# Altium footprint library Misc.PcbLib: 159 footprints (part 10 of 10)
Each footprint in its own frame and in the unit in brackets; x right, y up, seen from the top. Pads: shape width x height; smd on the part's side, far side on the other; paste and mask are expansions set on the pad; w line width, h text height; cw(c..) or ccw(c..) is an arc to the next point about the centre after c.
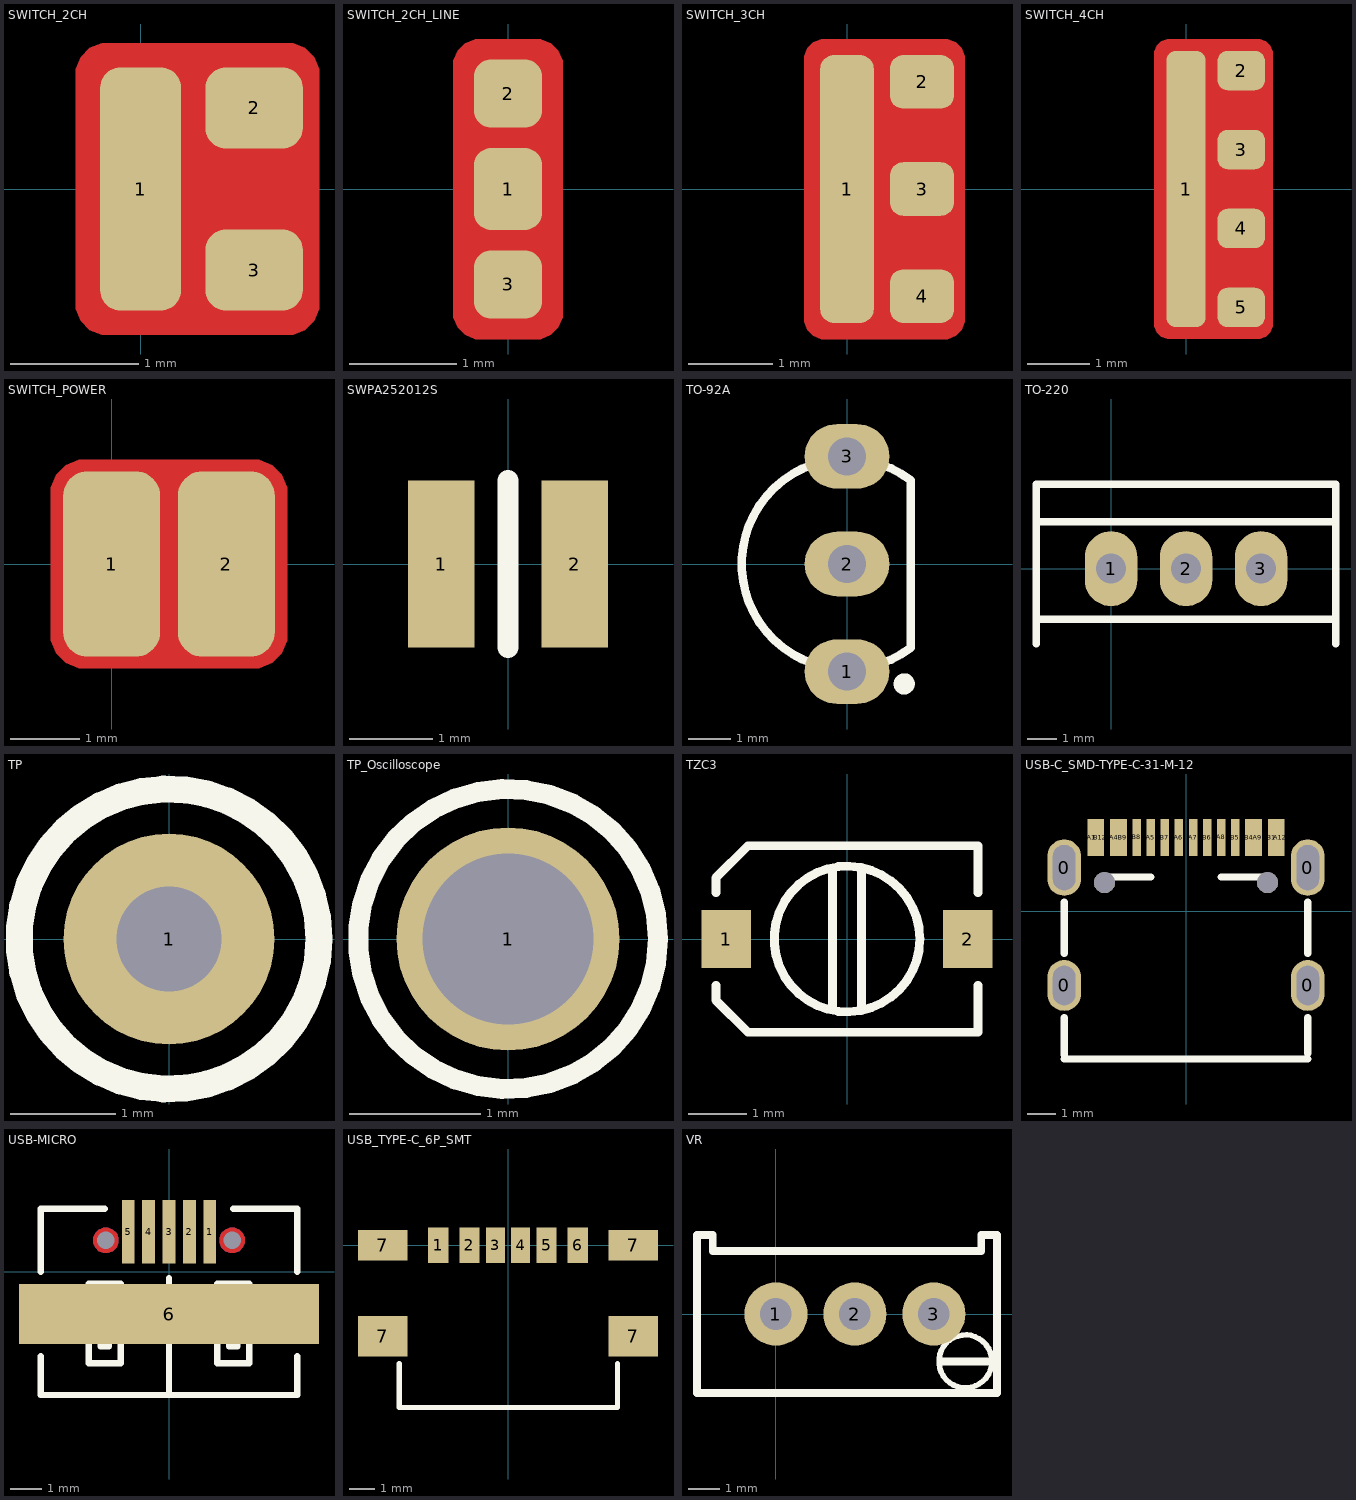
[diagram p9: the footprints below, top view; thin cyan lines are the x and y axes]

## SWITCH_2CH [mil]
pads (3):
  rrect50% 25x75 smd: 1(0,0)
  rrect50% 30x25 smd: 2(35,25) 3(35,-25)
Top Layer:
  pour cut-out: -20,35 -20,36.99 -18.48,40.66 -15.66,43.48 -11.99,45 -10,45 45,45 46.99,45 50.66,43.48 53.48,40.66 55,36.99 55,35 55,-35 55,-36.99 53.48,-40.66 50.66,-43.48 46.99,-45 45,-45 -10,-45 -11.99,-45 -15.66,-43.48 -18.48,-40.66 -20,-36.99 -20,-35
Top Solder:
  rectangle: 35,-35 52.5,35
  rectangle: 0,-40 35,40
  lines w3: 0,-40 35,-40 ; 0,40 35,40 ; 52.5,-25 52.5,25

## SWITCH_2CH_LINE [mil]
pads (3):
  rrect50% 25x30 smd: 1(0,0)
  rrect50% 25x25 smd: 2(0,35) 3(0,-35)
Top Layer:
  pour cut-out: -20,45 -20,46.99 -18.48,50.66 -15.66,53.48 -11.99,55 -10,55 10,55 11.99,55 15.66,53.48 18.48,50.66 20,46.99 20,45 20,-45 20,-46.99 18.48,-50.66 15.66,-53.48 11.99,-55 10,-55 -10,-55 -11.99,-55 -15.66,-53.48 -18.48,-50.66 -20,-46.99 -20,-45
Top Solder:
  rectangle: -15,-40 15,40
  lines w3: -15,-35 -15,35 ; 15,-35 15,35

## SWITCH_3CH [mil]
pads (4):
  rrect50% 25x125 smd: 1(0,0)
  rrect50% 30x25 smd: 2(35,50) 3(35,0) 4(35,-50)
Top Layer:
  pour cut-out: -20,60 -20,61.99 -18.48,65.66 -15.66,68.48 -11.99,70 -10,70 45,70 46.99,70 50.66,68.48 53.48,65.66 55,61.99 55,60 55,-60 55,-61.99 53.48,-65.66 50.66,-68.48 46.99,-70 45,-70 -10,-70 -11.99,-70 -15.66,-68.48 -18.48,-65.66 -20,-61.99 -20,-60
Top Solder:
  rectangle: 0,-65 35,65
  rectangle: 35,-50 52.5,50
  lines w3: 0,-65 35,-65 ; 0,65 35,65 ; 52.5,-50 52.5,50

## SWITCH_4CH [mil]
pads (5):
  rrect50% 25x175 smd: 1(0,0)
  rrect50% 30x25 smd: 2(35,75) 3(35,25) 4(35,-25) 5(35,-75)
Top Layer:
  pour cut-out: -20,85 -20,86.99 -18.48,90.66 -15.66,93.48 -11.99,95 -10,95 45,95 46.99,95 50.66,93.48 53.48,90.66 55,86.99 55,85 55,-85 55,-86.99 53.48,-90.66 50.66,-93.48 46.99,-95 45,-95 -10,-95 -11.99,-95 -15.66,-93.48 -18.48,-90.66 -20,-86.99 -20,-85
Top Solder:
  rectangle: 0,-90 35,90
  rectangle: 35,-75 52.5,75
  lines w3: -5,-90 30,-90 ; 0,90 35,90 ; 52.5,-75 52.5,75

## SWITCH_POWER [mil]
pads (2):
  rrect50% 55x105 smd: 1(0,0) 2(65,0)
Top Layer:
  pour cut-out: -34.43,39.37 -34.43,43.29 -31.43,50.52 -25.89,56.06 -18.66,59.06 -14.74,59.06 79.74,59.06 83.66,59.06 90.89,56.06 96.43,50.52 99.43,43.29 99.43,39.37 99.43,-39.37 99.43,-43.29 96.43,-50.52 90.89,-56.06 83.66,-59.06 79.74,-59.06 -14.74,-59.06 -18.66,-59.06 -25.89,-56.06 -31.43,-50.52 -34.43,-43.29 -34.43,-39.37
Top Solder:
  rectangle: 0,-55 65,55
  lines w3: 0,-55 65,-55 ; 0,55 65,55

## SWPA252012S [mm] "Wire Wound SMD Power Inductors"
height 1.2
pads (2):
  rect 0.8x2 smd: 1(-0.8,0) 2(0.8,0)
Top Overlay:
  lines w0.254: 0,-1 0,1
3D body: height 1.45, standoff 0, extent -1.25,-1 1.25,1

## TO-92A [mm] "TO, Flat Index; 3 In-Line, Axial Leads; Body Dia. 4.5mm; Leads 0.51 x 0.48 mm (max)"
height 6.86
pads (3):
  oval 2x1.524 hole 0.9: 1(0,-2.54) 2(0,0) 3(0,2.54)
Top Overlay:
  circle w0.25: c1.35,-2.83 r0.125
  lines w0.2: 1.5,-1.98 cw(c0,0) 1.5,1.98 1.5,-1.98
Mechanical 13:
  lines w0.1: 1.5,-1.98 cw(c0,0) 1.5,1.98 1.5,-1.98
Mechanical 15:
  lines w0.1: -0.5,0 0.5,0 ; 0,-0.5 0,0.5
3D body: height 6.86, standoff 2.2, extent -2.485,-2.495 1.501,2.495

## TO-220 [mil]
pads (3):
  oval 70x100 hole 40: 1(0,0) 2(100,0) 3(200,0)
Top Overlay:
  lines w10: -100,62.6 300,62.6 ; -99.56,-100 -100,-99.56 -100,112.6 300,112.6 300,-99.56 299.56,-100 ; -99.56,-67.52 299.56,-67.52
3D body "User Library-TO-220-1.STEP": height 740.16, standoff -392.91, extent -93.88,-83 295.89,94.16

## TP [mm]
pads (1):
  round 2 hole 1: 1(0,0)
Top Overlay:
  circle w0.254: c0,0 r1.422
3D body "User Library-TEST POINT RED Keystone 5010.step": height 8.13, standoff -3.1, extent -1.714,-1.46 1.461,1.715

## TP_Oscilloscope [mm]
pads (1):
  round 1.7 hole 1.3: 1(0,0)
Top Overlay:
  circle w0.152: c0,0 r1.143

## TZC3 [mm]
height 1.6
pads (2):
  rect 0.85x1 smd: 1(-2.075,0) 2(2.075,0)
Top Overlay:
  circle w0.152: c0,0 r1.25
  lines w0.152: -2.25,-0.8 -2.25,-1.05 -1.7,-1.6 2.25,-1.6 2.25,-0.8 ; -2.25,0.8 -2.25,1.05 -1.7,1.6 2.25,1.6 2.25,0.8 ; -0.25,-1.2 -0.25,1.2 ; 0.25,-1.2 0.25,1.2

## USB-C_SMD-TYPE-C-31-M-12 [mm]
pads (22):
  oval 1.2x1.8 hole 0.8 slot 1.4 at 90 deg: 0(-4.32,-2.624) 0(4.32,-2.624)
  oval 1.2x2 hole 0.8 slot 1.6 at 90 deg: 0(-4.32,1.556) 0(4.32,1.556)
  rect 0.3x1.3 smd: A1(-3.35,2.623) A4(-2.55,2.623) A5(-1.25,2.623) A6(-0.25,2.623) A7(0.25,2.623) A8(1.25,2.624) A9(2.55,2.623) A12(3.35,2.623) B1(3.05,2.623) B4(2.25,2.623) B5(1.75,2.623) B6(0.75,2.623) B7(-0.75,2.623) B8(-1.75,2.624) B9(-2.25,2.623) B12(-3.05,2.623)
  round 0.75 hole 0.75 unplated: ""(-2.89,1.026) ""(2.89,1.026)
Top Overlay:
  lines w0.254: -4.32,-5.227 4.32,-5.227 ; -4.32,-5.091 -4.32,-3.755 ; -4.32,-1.493 -4.32,0.325 ; -3,1.221 -1.25,1.221 ; 1.247,1.224 2.997,1.224 ; 4.32,-5.04 4.32,-3.755 ; 4.32,-1.493 4.32,0.325

## USB-MICRO [mm]
pads (8):
  round 0 hole 0.55 unplated: 0(-2,1) 0(2,1)
  rect 0.4x2 smd: 1(1.295,1.27) 2(0.648,1.27) 3(0,1.27) 4(-0.648,1.27) 5(-1.295,1.27)
  rect 9.5x1.9 smd: 6(0,-1.333)
Top Layer:
  pour cut-out: 2,1.4 2.08,1.4 2.227,1.339 2.339,1.227 2.4,1.08 2.4,1 2.4,0.92 2.339,0.773 2.227,0.661 2.08,0.6 2,0.6 1.92,0.6 1.773,0.661 1.661,0.773 1.6,0.92 1.6,1 1.6,1.08 1.661,1.227 1.773,1.339 1.92,1.4
  pour cut-out: -2,1.4 -1.92,1.4 -1.773,1.339 -1.661,1.227 -1.6,1.08 -1.6,1 -1.6,0.92 -1.661,0.773 -1.773,0.661 -1.92,0.6 -2,0.6 -2.08,0.6 -2.227,0.661 -2.339,0.773 -2.4,0.92 -2.4,1 -2.4,1.08 -2.339,1.227 -2.227,1.339 -2.08,1.4
Bottom Layer:
  pour cut-out: -2,1.4 -1.92,1.4 -1.773,1.339 -1.661,1.227 -1.6,1.08 -1.6,1 -1.6,0.92 -1.661,0.773 -1.773,0.661 -1.92,0.6 -2,0.6 -2.08,0.6 -2.227,0.661 -2.339,0.773 -2.4,0.92 -2.4,1 -2.4,1.08 -2.339,1.227 -2.227,1.339 -2.08,1.4
  pour cut-out: 2,1.4 2.08,1.4 2.227,1.339 2.339,1.227 2.4,1.08 2.4,1 2.4,0.92 2.339,0.773 2.227,0.661 2.08,0.6 2,0.6 1.92,0.6 1.773,0.661 1.661,0.773 1.6,0.92 1.6,1 1.6,1.08 1.661,1.227 1.773,1.339 1.92,1.4
Top Overlay:
  lines w0.203: -4.064,-3.899 4.064,-3.899 4.064,-2.667 ; -4.064,-3.873 -4.064,-2.667 ; -4.064,0 -4.064,1.994 -2.032,1.994 ; -2.159,-0.381 -2.159,-2.362 -1.905,-2.362 -1.905,-0.381 ; 0,-3.899 0,-0.2 ; 1.905,-0.381 1.905,-2.362 2.159,-2.362 2.159,-0.381 ; 2.032,1.994 4.064,1.994 4.064,0 ; -2.54,-2.896 -1.524,-2.896 -1.524,-0.381 -2.54,-0.381 -2.54,-2.896 ; 1.524,-2.896 1.524,-0.381 2.54,-0.381 2.54,-2.896 1.524,-2.896
3D body "MICRO USB.STEP": height 2.77, standoff -0.17, extent -4.1,-3.88 4.1,2.05

## USB_TYPE-C_6P_SMT [mm]
height 1.45
pads (10):
  rect 0.8x1.4 smd: 1(-2.75,0) 2(-1.52,0) 5(1.52,0) 6(2.75,0)
  rect 0.75x1.4 smd: 3(-0.5,0) 4(0.5,0)
  rect 1.95x1.6 smd: 7(-4.945,-3.6) 7(4.945,-3.6)
  rect 1.95x1.2 smd: 7(-4.945,0) 7(4.945,0)
Top Overlay:
  lines w0.203: -4.293,-4.674 -4.293,-6.401 4.318,-6.401 4.318,-4.674
3D body: height 3, standoff 0, extent -4.3,-6.4 4.3,0.5

## VR [mil]
pads (3):
  round 80 hole 40: 1(0,0) 2(100,0) 3(200,0)
Top Overlay:
  circle w7: c240,-60 r33.54
  lines w10: 210,-60 273.54,-60 ; -100,-100 -100,100 -80,100 -80,80 260,80 260,100 280,100 280,-100 -100,-100
3D body "User Library-67W.STEP": height 479.45, standoff -161.1, extent -90.91,-96.88 294.92,98